# Altium footprint library MOD-STM32F401.PcbLib: 1 footprints
Each footprint in its own frame and in the unit in brackets; x right, y up, seen from the top. Pads: shape width x height; smd on the part's side, far side on the other; paste and mask are expansions set on the pad; w line width, h text height; cw(c..) or ccw(c..) is an arc to the next point about the centre after c.
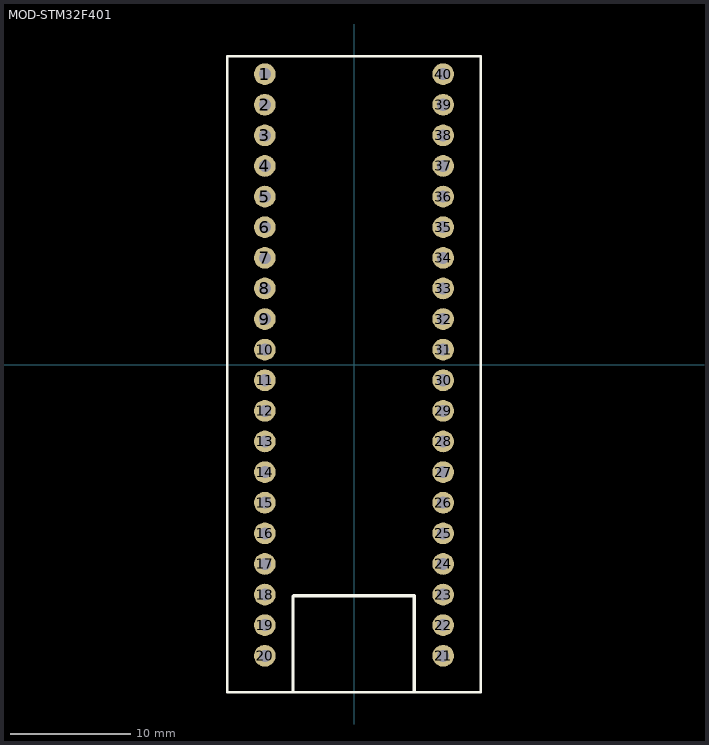
[diagram p0: the footprint, top view; thin cyan lines are the x and y axes]

## MOD-STM32F401 [mm]
height 0.9
pads (40):
  round 1.8 hole 1: 1(-7.4,24.13) 2(-7.4,21.59) 3(-7.4,19.05) 4(-7.4,16.51) 5(-7.4,13.97) 6(-7.4,11.43) 7(-7.4,8.89) 8(-7.4,6.35) 9(-7.4,3.81) 10(-7.4,1.27) 11(-7.4,-1.27) 12(-7.4,-3.81) 13(-7.4,-6.35) 14(-7.4,-8.89) 15(-7.4,-11.43) 16(-7.4,-13.97) 17(-7.4,-16.51) 18(-7.4,-19.05) 19(-7.4,-21.59) 20(-7.4,-24.13) 21(7.4,-24.13) 22(7.4,-21.59) 23(7.4,-19.05) 24(7.4,-16.51) 25(7.4,-13.97) 26(7.4,-11.43) 27(7.4,-8.89) 28(7.4,-6.35) 29(7.4,-3.81) 30(7.4,-1.27) 31(7.4,1.27) 32(7.4,3.81) 33(7.4,6.35) 34(7.4,8.89) 35(7.4,11.43) 36(7.4,13.97) 37(7.4,16.51) 38(7.4,19.05) 39(7.4,21.59) 40(7.4,24.13)
Top Overlay:
  lines w0.2: -10.5,25.6 -10.5,-27.15 10.5,-27.15 10.5,25.6 -10.375,25.6
  lines w0.254: -5.075,-27.125 -5.075,-19.2 -5.025,-19.15 5,-19.15 5,-27.025
Top Assembly:
  lines w0.1: -10.5,-27.15 10.5,-27.15 10.5,25.65 -10.5,25.65 -10.5,-27.15
  text "'.Designator'" at -0.95,0.075 h0.7
3D body "User Library-minif4_board-1.STEP": height 7.56, standoff 2.5, extent -10.39,-27.04 10.39,25.5
3D body "User Library-PLS-4R gold.STEP": height 9.45, standoff 1, extent -5.07,-27.7 5.09,-19.08
3D body "User Library-PLS-10.STEP": height 5.5, standoff -6.04, extent 6.1,-25.4 8.64,0
3D body "User Library-PLS-10.STEP": height 5.5, standoff -6.04, extent -8.7,0 -6.16,25.4
3D body "User Library-PLS-10.STEP": height 5.5, standoff -6.04, extent -8.7,-25.4 -6.16,0
3D body "User Library-PLS-10.STEP": height 5.5, standoff -6.04, extent 6.1,0 8.64,25.4